# Altium footprint library Raspberry_Pi4B_3D.PcbLib: 1 footprints
Each footprint in its own frame and in the unit in brackets; x right, y up, seen from the top. Pads: shape width x height; smd on the part's side, far side on the other; paste and mask are expansions set on the pad; w line width, h text height; cw(c..) or ccw(c..) is an arc to the next point about the centre after c.

## PCBComponent_1 [mm]
3D body "Raspberry Pi 4 Model B.SLDPRT": height 30.4, standoff -28, extent 0,0 88.99,19.9